# Altium footprint library PCB.PcbLib: 72 footprints (part 2 of 5)
Each footprint in its own frame and in the unit in brackets; x right, y up, seen from the top. Pads: shape width x height; smd on the part's side, far side on the other; paste and mask are expansions set on the pad; w line width, h text height; cw(c..) or ccw(c..) is an arc to the next point about the centre after c.
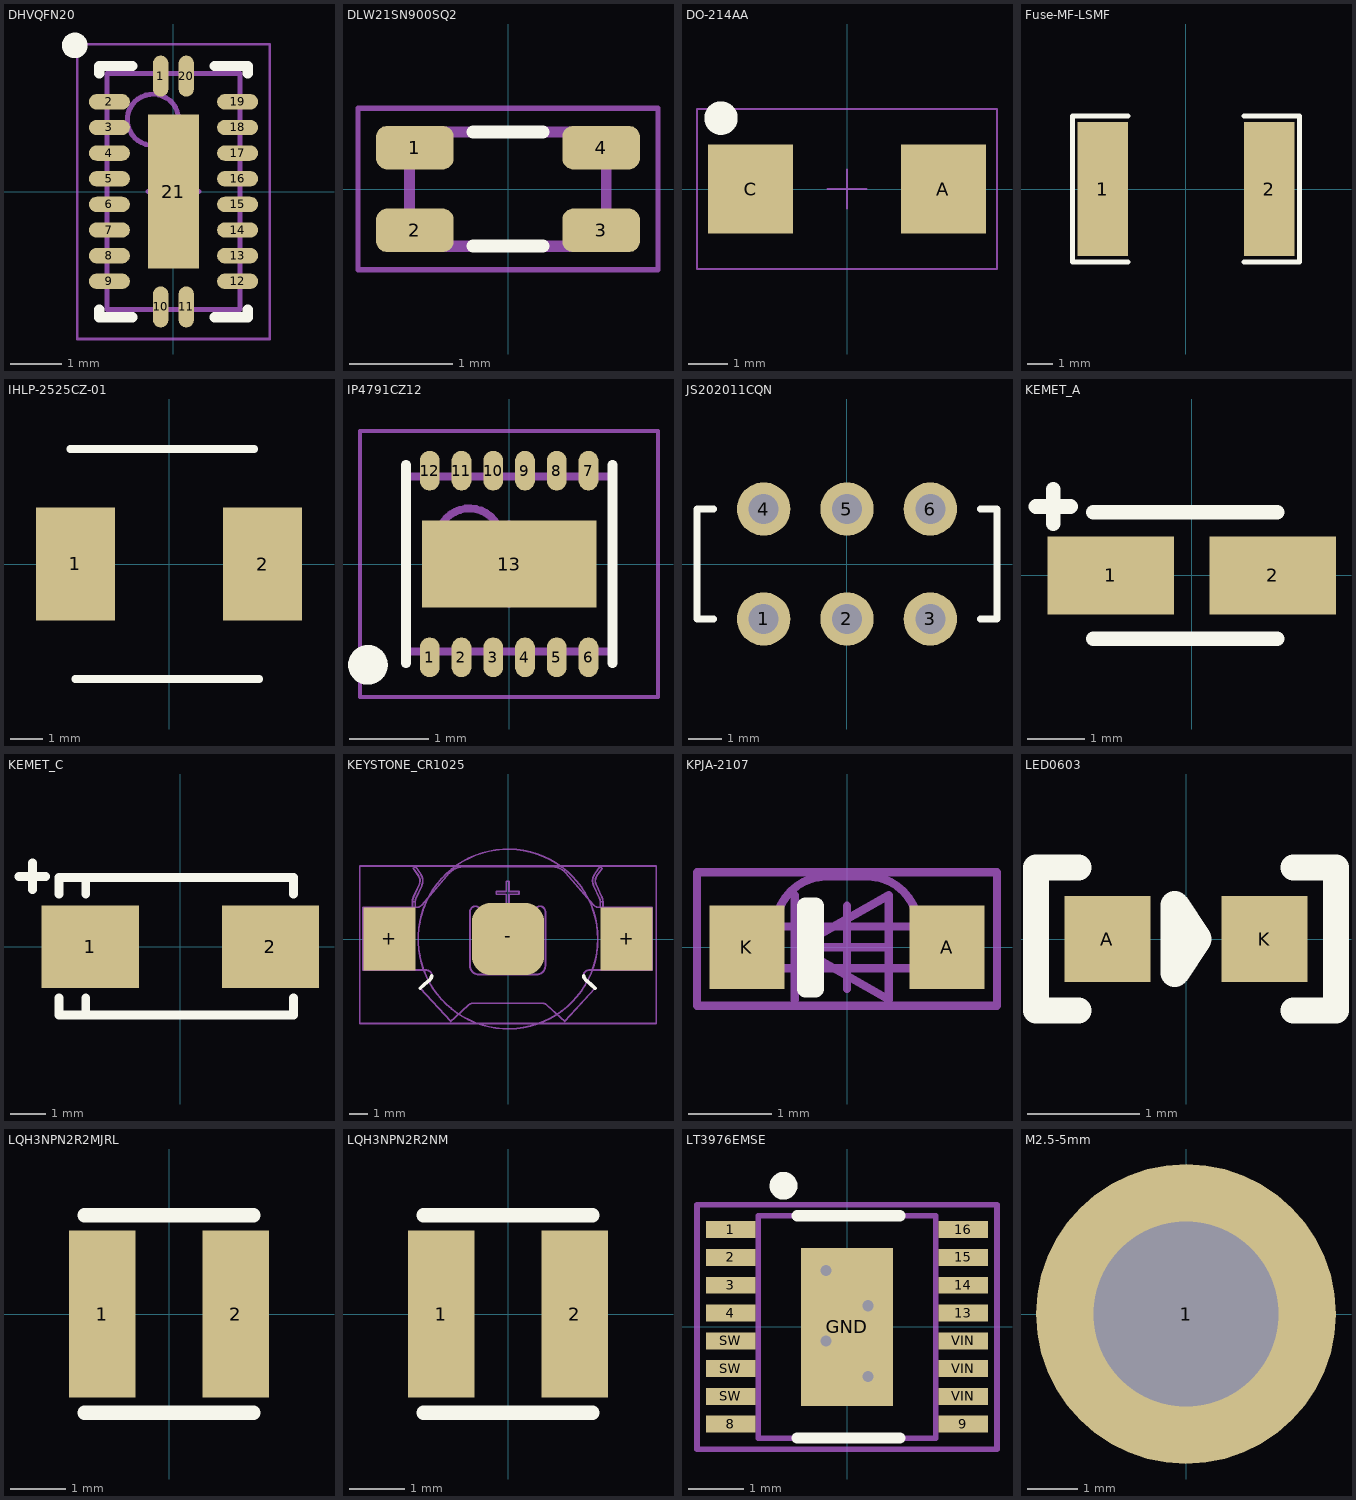
[diagram p1: the footprints below, top view; thin cyan lines are the x and y axes]

## DHVQFN20 [mm] "QFN, 20-Leads, Body 2,50x4,50mm, Pitch 0,50mm, Thermal Pad 1,00x3,00mm, IPC Medium Density"
height 1
pads (21):
  oval 0.3x0.8 smd: 1(-0.25,2.25) 10(-0.25,-2.25) 11(0.25,-2.25) 20(0.25,2.25)
  oval 0.8x0.3 smd: 2(-1.25,1.75) 3(-1.25,1.25) 4(-1.25,0.75) 5(-1.25,0.25) 6(-1.25,-0.25) 7(-1.25,-0.75) 8(-1.25,-1.25) 9(-1.25,-1.75) 12(1.25,-1.75) 13(1.25,-1.25) 14(1.25,-0.75) 15(1.25,-0.25) 16(1.25,0.25) 17(1.25,0.75) 18(1.25,1.25) 19(1.25,1.75)
  rect 1x3 smd: 21(0,0)
Top Overlay:
  circle w0.25: c-1.925,2.85 r0.125
  lines w0.2: -1.45,-2.3 -1.45,-2.45 -0.8,-2.45 ; -1.45,2.3 -1.45,2.45 -0.8,2.45 ; 0.8,-2.45 1.45,-2.45 1.45,-2.3 ; 0.8,2.45 1.45,2.45 1.45,2.3
Mechanical 13:
  circle w0.1: c-0.4,1.4 r0.5
  lines w0.1: -1.3,-2.3 1.3,-2.3 1.3,2.3 -1.3,2.3 -1.3,-2.3
Mechanical 15:
  lines w0.05: -1.875,-2.875 1.875,-2.875 1.875,2.875 -1.875,2.875 -1.875,-2.875
  lines w0.1: -0.5,0 0.5,0 ; 0,-0.5 0,0.5
3D body: height 1, standoff 0.05, extent -1.3,-2.3 1.3,2.3

## DLW21SN900SQ2 [mm]
pads (4):
  rrect50% 0.75x0.42 smd: 1(-0.9,0.4) 2(-0.9,-0.4) 3(0.9,-0.4) 4(0.9,0.4)
Top Overlay:
  lines w0.127: -0.34,-0.55 0.34,-0.55 ; -0.34,0.55 0.34,0.55
Mechanical 2:
  lines w0.001: -1,-0.6 1,-0.6 1,0.6 -1,0.6 -1,-0.6
Mechanical 3:
  lines w0.05: -1.45,-0.78 1.45,-0.78 1.45,0.78 -1.45,0.78 -1.45,-0.78
  lines w0.1: -0.95,-0.55 0.95,-0.55 0.95,0.55 -0.95,0.55 -0.95,-0.55
3D body: height 1.2, standoff 0, extent -1,-0.6 1,0.6

## DO-214AA [mm]
pads (2):
  rect 2.16x2.26 smd: A(2.45,0) C(-2.45,0)
Top Overlay:
  circle w0.5: c-3.2,1.8 r0.175
Mechanical 15:
  lines w0.051: -0.5,0 0.5,0 ; 0,-0.5 0,0.5 ; -3.81,-2.032 3.81,-2.032 3.81,2.032 -3.81,2.032 -3.81,-2.032
3D body: height 2.45, standoff 0.03, extent -2.75,-1.95 2.75,1.95

## Fuse-MF-LSMF [mm]
pads (2):
  rect 2x5.3 smd: 1(-3.3,0) 2(3.3,0)
Top Overlay:
  lines w0.2: -2.3,-2.9 -4.5,-2.9 -4.5,2.9 -2.3,2.9 ; 2.3,-2.9 4.5,-2.9 4.5,1.9 4.5,2.9 2.3,2.9
3D body: height 0.6, standoff 0, extent -3.667,-2.56 3.668,2.56

## IHLP-2525CZ-01 [mm]
pads (2):
  rect 2.4x3.43 smd: 1(-2.85,0) 2(2.85,0)
Top Overlay:
  lines w0.229: -3,3.5 2.6,3.5 ; -2.85,-3.5 2.75,-3.5
3D body: height 3, standoff 0, extent -3.25,-3.25 3.25,3.25

## IP4791CZ12 [mm]
height 0.5
pads (13):
  oval 0.25x0.5 smd: 1(-1,-1.175) 2(-0.6,-1.175) 3(-0.2,-1.175) 4(0.2,-1.175) 5(0.6,-1.175) 6(1,-1.175) 7(1,1.175) 8(0.6,1.175) 9(0.2,1.175) 10(-0.2,1.175) 11(-0.6,1.175) 12(-1,1.175)
  rect 2.2x1.1 smd: 13(0,0)
Top Overlay:
  circle w0.25: c-1.778,-1.27 r0.125
  lines w0.125: -1.3,-1.25 -1.3,1.25 ; 1.3,-1.25 1.3,1.25
Mechanical 13:
  circle w0.1: c-0.5,0.3 r0.4
  lines w0.1: -1.3,-1.1 1.3,-1.1 1.3,1.1 -1.3,1.1 -1.3,-1.1
Mechanical 15:
  lines w0.05: -1.875,-1.675 1.875,-1.675 1.875,1.675 -1.875,1.675 -1.875,-1.675
  lines w0.1: -0.5,0 0.5,0 ; 0,-0.5 0,0.5
3D body: height 0.5, standoff 0.01, extent -1.3,-1.1 1.3,1.1

## JS202011CQN [mm]
pads (6):
  round 1.6 hole 0.9: 1(-2.5,-1.65) 2(0,-1.65) 3(2.5,-1.65) 4(-2.5,1.65) 5(0,1.65) 6(2.5,1.65)
Top Overlay:
  lines w0.2: -4,-1.65 -4.5,-1.65 -4.5,0.05 -4.5,1.65 -4,1.65 ; 4,-1.65 4.5,-1.65 4.5,0.05 4.5,1.65 4,1.65
3D body: height 5.22, standoff -3.28, extent -4.5,-1.8 4.5,1.8

## KEMET_A [mm] "Kemet A size package. Low desity level"
height 1.6
pads (2):
  rect 2.2x1.35 smd: 1(-1.41,0) 2(1.41,0)
Top Overlay:
  lines w0.254: -2.71,1.2 -2.11,1.2 ; -2.41,0.9 -2.41,1.5 ; -1.71,-1.1 1.49,-1.1 ; -1.71,1.1 1.49,1.1
3D body: height 1.81, standoff 0.01, extent -1.81,-0.9 1.59,0.9

## KEMET_C [mm] "Kemet C size package. Low desity level"
height 2.5
pads (2):
  rect 2.77x2.35 smd: 1(-2.57,0) 2(2.57,0)
Top Overlay:
  lines w0.254: -4.601,2 -3.839,2 ; -4.22,1.619 -4.22,2.381 ; -3.458,-1.467 -3.458,-1.95 3.23,-1.95 3.23,-1.467 ; -3.458,1.492 -3.458,1.975 3.23,1.975 3.23,1.492 ; -2.696,-1.925 -2.696,-1.467 ; -2.696,1.492 -2.696,1.95
3D body: height 2.81, standoff 0.01, extent -3.245,-1.725 3.055,1.775

## KEYSTONE_CR1025 [mm]
pads (3):
  rect 2.9x3.5 smd: +(-6.6,0) +(6.6,0)
  rrect50% 4x4 smd: -(0,0)
Top Overlay:
  lines w0.2: -4.877,-2.744 -4.655,-2.537 -4.337,-2.251 -4.289,-2.188 -4.284,-2.175 -4.279,-2.162 -4.273,-2.149 -4.268,-2.135 -4.263,-2.122 -4.259,-2.109 -4.255,-2.096 -4.251,-2.083 -4.248,-2.069 -4.246,-2.056 ; 4.211,-2.056 4.214,-2.069 4.217,-2.082 4.221,-2.096 4.225,-2.109 4.23,-2.122 4.235,-2.135 4.24,-2.149 4.245,-2.162 4.251,-2.175 4.257,-2.188 4.304,-2.251 4.622,-2.537 4.844,-2.744
Mechanical 13:
  drawing of 624 lines, arcs and shapes, not listed
Mechanical 15:
  lines w0.1: -0.5,0 0.5,0 ; 0,-0.5 0,0.5 ; -8.255,-4.699 -8.255,4.064 -8.128,4.064 8.255,4.064 8.255,-4.699 -8.255,-4.699
Mechanical 16:
  circle w0.1: c0,0 r5
Mechanical 17:
  text "Battery insert" at -6.5,6 h1
3D body: height 2.95, standoff 0, extent -8.052,-4.608 8.052,4

## KPJA-2107 [mm]
pads (2):
  rect 0.9x1 smd: A(1.2,0) K(-1.2,0)
Top Overlay:
  lines w0.2: -0.5,-0.5 -0.5,0.5 -0.375,0.5 -0.375,-0.5 -0.5,-0.5
Mechanical 13:
  lines w0.1: -0.85,0.25 cw(c-0.25,0.25) -0.25,0.85 0.25,0.85 cw(c0.25,0.25) 0.85,0.25 ; -1.05,-0.25 1.05,-0.25 1.05,0.25 -1.05,0.25 -1.05,-0.25
Mechanical 15:
  lines w0.1: -0.5,0 0.5,0 ; 0,-0.5 0,0.5 ; -1.8,-0.7 1.8,-0.7 1.8,0.9 -1.8,0.9 -1.8,-0.7
Mechanical 16:
  lines w0.1: -0.625,-0.625 -0.625,0.625 ; -0.6,0 0.5,0.625 0.5,-0.625 -0.6,0

## LED0603 [mil]
pads (2):
  rect 30x30 smd: A(-27.5,0) K(27.5,0)
Top Overlay:
  lines w9: -37.5,-25 -52.5,-25 -52.5,25 -37.5,25 ; 37.5,-25 52.5,-25 52.5,25 37.5,25
  lines w10: -3.88,-11.81 -3.88,11.81 4,0 -3.88,-11.81
3D body: height 43.31, standoff 0, extent -31.83,-15.75 31.95,15.74

## LQH3NPN2R2MJRL [mm]
height 1.4
pads (2):
  rect 1.2x3 smd: 1(-1.2,0) 2(1.2,0)
Top Overlay:
  lines w0.254: -1.524,-1.778 1.524,-1.778 ; -1.524,1.778 1.524,1.778
3D body: height 1.4, standoff 0.1, extent -1.524,-1.524 1.524,1.651

## LQH3NPN2R2NM [mm]
height 1.4
pads (2):
  rect 1.2x3 smd: 1(-1.2,0) 2(1.2,0)
Top Overlay:
  lines w0.254: -1.524,-1.778 1.524,-1.778 ; -1.524,1.778 1.524,1.778
3D body: height 1.4, standoff 0.1, extent -1.524,-1.524 1.524,1.651

## LT3976EMSE [mm]
height 1.1
pads (17):
  rect 0.889x0.305 smd: 1(-2.095,1.75) 2(-2.095,1.25) 3(-2.095,0.75) 4(-2.095,0.25) 8(-2.095,-1.75) 9(2.095,-1.75) 13(2.095,0.25) 14(2.095,0.75) 15(2.095,1.25) 16(2.095,1.75) SW(-2.095,-1.25) SW(-2.095,-0.75) SW(-2.095,-0.25) VIN(2.095,-1.25) VIN(2.095,-0.75) VIN(2.095,-0.25)
  rect 1.651x2.845 smd: GND(0,0)
via -0.381,1.016 diameter 0.55 hole 0.2
via 0.381,0.381 diameter 0.55 hole 0.2
via -0.381,-0.254 diameter 0.55 hole 0.2
via 0.381,-0.889 diameter 0.55 hole 0.2
Top Overlay:
  circle w0.25: c-1.143,2.54 r0.125
  lines w0.2: -0.895,-2 0.954,-2 ; -0.895,2 0.954,2
Mechanical 13:
  lines w0.1: -1.6,-2 -1.6,2 1.6,2 1.6,-2 -1.6,-2
Mechanical 15:
  lines w0.1: -0.5,0 0.5,0 ; 0,-0.5 0,0.5 ; -2.7,-2.2 -2.7,2.2 -0.5,2.2 2.7,2.2 2.7,-2.2 -2.7,-2.2
3D body: height 1.1, standoff 0.1, extent -1.651,-2.032 1.651,2.032

## M2.5-5mm [mm] "SMT Steel Spacer, M2.5 Thread Internal, 5mm"
height 5
pads (1):
  round 6 / inner round 0 / far side round 0 hole 3.7 unplated paste-403.566: 1(0,0)
Top Paste:
  drawing of 4 lines, arcs and shapes, not listed
Mechanical 13:
  circle w0.12: c0,0 r2.55
3D body: height 5, standoff -1.4, extent -2.55,-2.545 2.53,2.545